# Altium footprint library IDC座子10-64PIN.PcbLib: 24 footprints (part 1 of 2)
Each footprint in its own frame and in the unit in brackets; x right, y up, seen from the top. Pads: shape width x height; smd on the part's side, far side on the other; paste and mask are expansions set on the pad; w line width, h text height; cw(c..) or ccw(c..) is an arc to the next point about the centre after c.
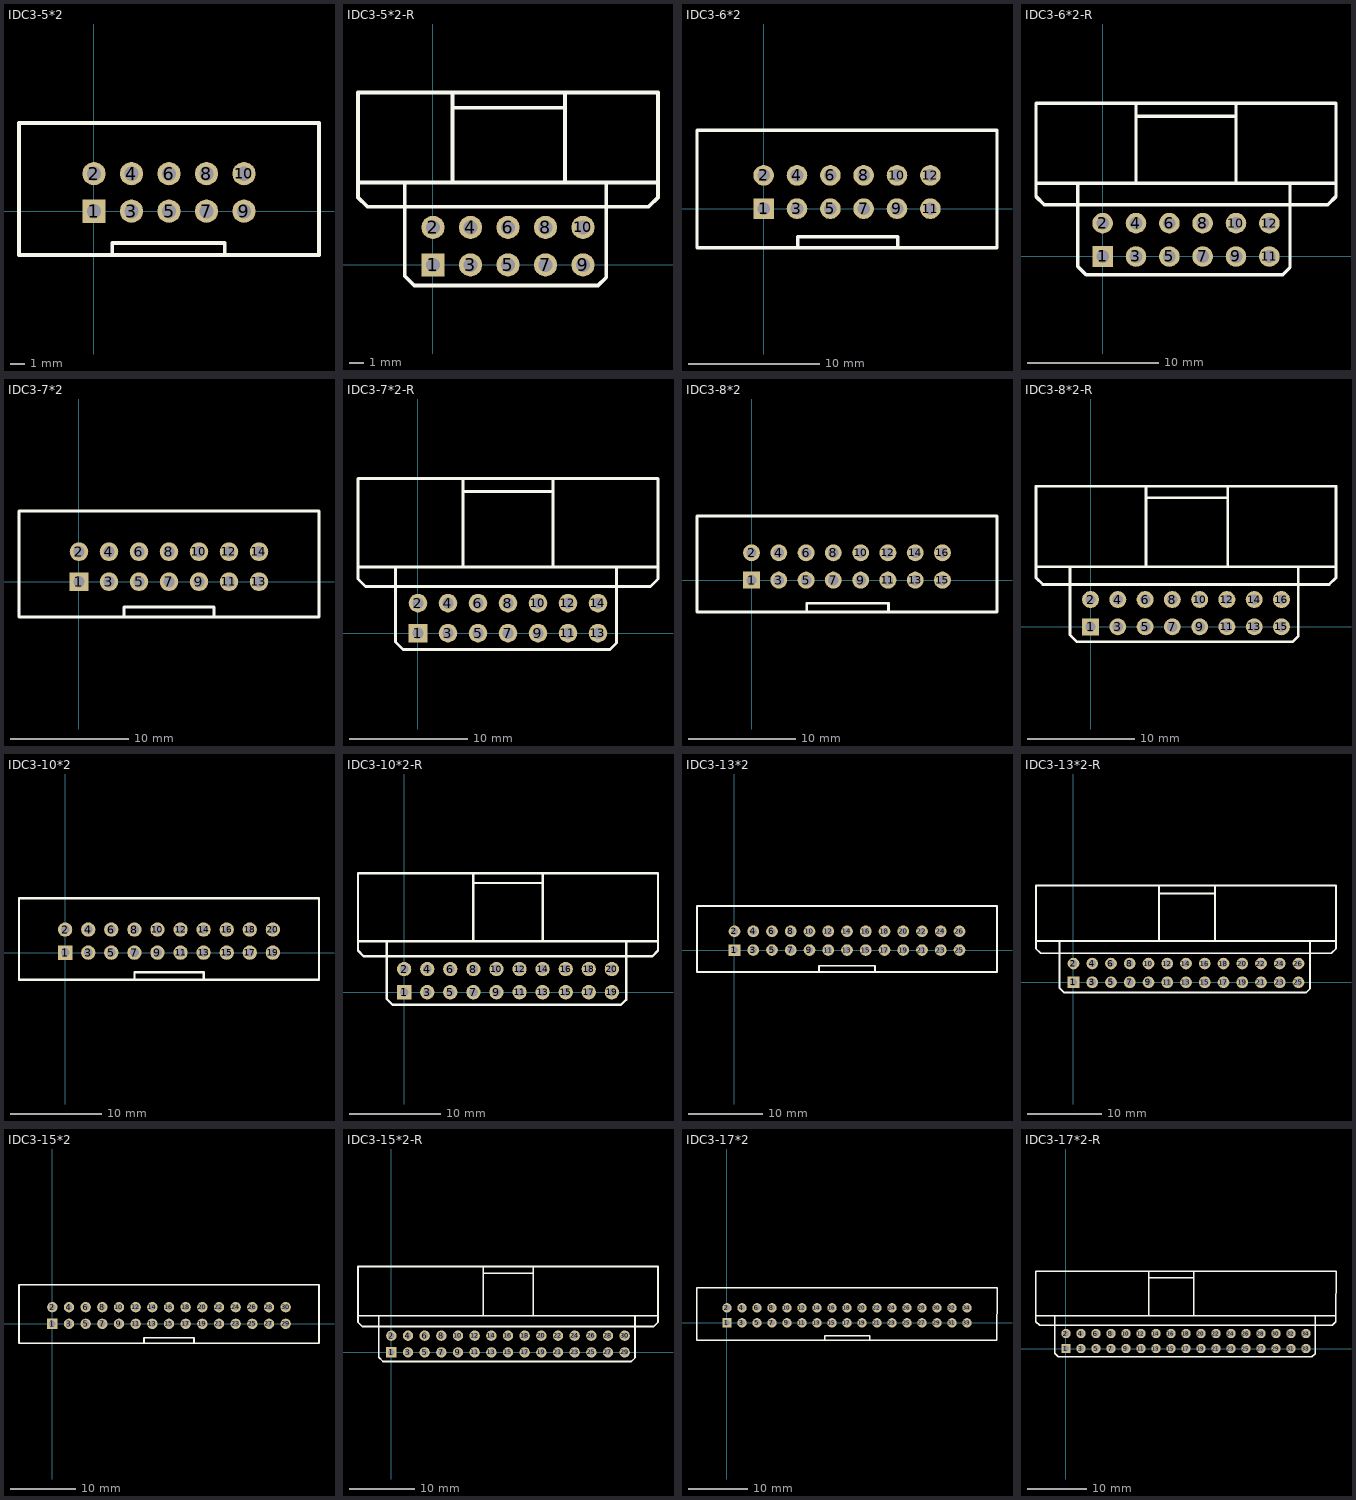
[diagram p0: the footprints below, top view; thin cyan lines are the x and y axes]

## IDC3-5*2 [mil]
pads (10):
  rect 62x62 hole 38: 1(0,0)
  round 62 hole 38: 2(0,100) 3(100,0) 4(100,100) 5(200,0) 6(200,100) 7(300,0) 8(300,100) 9(400,0) 10(400,100)
TopOverlay:
  lines w10: 48.82,-115.67 48.82,-84.65 348.82,-84.65 348.82,-115.67 ; -200,-117.13 600,-117.13 600,235.24 -200,235.24 -200,-117.13
3D body "BH-10.STEP": height 354.33, standoff -133.86, extent -199.61,-117.13 599.61,237.2

## IDC3-5*2-R [mil]
pads (10):
  rect 62x62 hole 38: 1(0,0)
  round 62 hole 38: 2(0,100) 3(100,0) 4(100,100) 5(200,0) 6(200,100) 7(300,0) 8(300,100) 9(400,0) 10(400,100)
TopOverlay:
  lines w8: -76.12,220 -75,218.88
  lines w10: -75,218.88 -75,-30 -50,-55 440,-55 461.88,-33.12 461.88,220 ; 51.77,221.62 51.77,438.22 ; 51.77,458.22 51.77,419.29 351.77,419.29 351.77,458.22 351.77,220.19 ; 461.88,155 575,155 ; 600,221.58 600,460 -200,460 -200,220 ; -200,220 -200,180 -175,155 -75,155 575,155 ; -200,220 600,220 600,180 575,155
3D body "BH-10R.STEP": height 358.27, standoff -110.24, extent -199.61,-12.8 599.61,521.06

## IDC3-6*2 [mil]
pads (12):
  rect 62x62 hole 38: 1(0,0)
  round 62 hole 38: 2(0,100) 3(100,0) 4(100,100) 5(200,0) 6(200,100) 7(300,0) 8(300,100) 9(400,0) 10(400,100) 11(500,0) 12(500,100)
TopOverlay:
  lines w10: 101.97,-115.67 101.97,-84.65 401.97,-84.65 401.97,-115.67 ; -200,-117.13 -200,235.24 700,235.24 700,-117.13 -200,-117.13
3D body "BH-12.STEP": height 354.33, standoff -133.86, extent -198.82,-117.13 698.82,237.2

## IDC3-6*2-R [mil]
pads (12):
  rect 62x62 hole 38: 1(0,0)
  round 62 hole 38: 2(0,100) 3(100,0) 4(100,100) 5(200,0) 6(200,100) 7(300,0) 8(300,100) 9(400,0) 10(400,100) 11(500,0) 12(500,100)
TopOverlay:
  lines w8: -76.12,220 -75,218.88
  lines w10: -75,218.88 -75,-30 -50,-55 540,-55 561.88,-33.12 561.88,220 ; 100,222.61 100,439.2 ; 100,459.2 100,420.28 400,420.28 400,459.2 ; 400,220.78 400,439.2 ; 561.88,155 675,155 ; -200,220 700,220 ; -200,220 -200,460 700,460 700,220 ; -200,220 -200,180 -175,155 -75,155 675,155 ; 675,155 700,180 700,220
3D body "BH-12R.STEP": height 358.27, standoff -110.24, extent -198.82,-11.22 698.82,522.64

## IDC3-7*2 [mil]
pads (14):
  rect 62x62 hole 38: 1(0,0)
  round 62 hole 38: 2(0,100) 3(100,0) 4(100,100) 5(200,0) 6(200,100) 7(300,0) 8(300,100) 9(400,0) 10(400,100) 11(500,0) 12(500,100) 13(600,0) 14(600,100)
TopOverlay:
  lines w10: 150.2,-115.67 150.2,-84.65 450.2,-84.65 450.2,-115.67 ; -200,-117.13 -200,235.24 800,235.24 800,-117.13 -200,-117.13
3D body "BH-14.STEP": height 354.33, standoff -133.86, extent -197.83,-122.05 802.17,232.28

## IDC3-7*2-R [mil]
pads (14):
  rect 62x62 hole 38: 1(0,0)
  round 62 hole 38: 2(0,100) 3(100,0) 4(100,100) 5(200,0) 6(200,100) 7(300,0) 8(300,100) 9(400,0) 10(400,100) 11(500,0) 12(500,100) 13(600,0) 14(600,100)
TopOverlay:
  lines w8: -76.12,220 -75,218.88
  lines w10: -75,218.88 -75,-30 -50,-55 640,-55 661.88,-33.12 661.88,220 ; 150,222.42 150,472.44 ; 150,514.76 150,472.44 ; 450,220.59 450,472.44 ; 450,514.76 450,472.44 ; 661.88,155 775,155 ; -200,220 -200,180 -175,155 -75,155 775,155 ; -200,220 -200,515.75 800,515.75 800,220 ; -200,220 800,220 ; 150,472.44 450,472.44 ; 775,155 800,180 800,220
3D body "BH-14R.STEP": height 358.27, standoff -110.24, extent -197.83,-13.78 802.17,520.08

## IDC3-8*2 [mil]
pads (16):
  rect 62x62 hole 38: 1(0,0)
  round 62 hole 38: 2(0,100) 3(100,0) 4(100,100) 5(200,0) 6(200,100) 7(300,0) 8(300,100) 9(400,0) 10(400,100) 11(500,0) 12(500,100) 13(600,0) 14(600,100) 15(700,0) 16(700,100)
TopOverlay:
  lines w10: 202.36,-115.67 202.36,-84.65 502.36,-84.65 502.36,-115.67 ; -200,-117.13 900,-117.13 900,235.24 -200,235.24 -200,-117.13
3D body "BH-16.STEP": height 354.33, standoff -133.86, extent -196.86,-116.14 901.57,238.19

## IDC3-8*2-R [mil]
pads (16):
  rect 62x62 hole 38: 1(0,0)
  round 62 hole 38: 2(0,100) 3(100,0) 4(100,100) 5(200,0) 6(200,100) 7(300,0) 8(300,100) 9(400,0) 10(400,100) 11(500,0) 12(500,100) 13(600,0) 14(600,100) 15(700,0) 16(700,100)
TopOverlay:
  lines w8: -76.12,220 -75,218.88
  lines w10: -75,218.88 -75,-30 -50,-55 740,-55 761.88,-33.12 761.88,220 ; 203.54,223.4 203.54,473.43 ; 203.54,515.75 203.54,473.43 ; 503.54,221.58 503.54,473.43 ; 503.54,515.75 503.54,473.43 ; 761.88,155 875,155 ; -200,220 -200,180 -175,155 -75,155 875,155 ; -200,220 -200,515.75 900,515.75 900,220 ; -200,220 900,220 ; 203.54,473.43 503.54,473.43 ; 875,155 900,180 900,220
3D body "BH-16R.STEP": height 358.27, standoff -110.24, extent -197.46,-15.9 900.96,517.96

## IDC3-10*2 [mil]
pads (20):
  rect 62x62 hole 38: 1(0,0)
  round 62 hole 38: 2(0,100) 3(100,0) 4(100,100) 5(200,0) 6(200,100) 7(300,0) 8(300,100) 9(400,0) 10(400,100) 11(500,0) 12(500,100) 13(600,0) 14(600,100) 15(700,0) 16(700,100) 17(800,0) 18(800,100) 19(900,0) 20(900,100)
TopOverlay:
  lines w10: 300.2,-115.67 300.2,-84.64 600.2,-84.64 600.2,-115.67 ; -200,-117.13 -200,235.24 1100,235.24 1100,-117.13 -200,-117.13
3D body "BH-20.STEP": height 354.33, standoff -133.86, extent -199.8,-116.14 1099.41,238.19

## IDC3-10*2-R [mil]
pads (20):
  rect 62x62 hole 38: 1(0,0)
  round 62 hole 38: 2(0,100) 3(100,0) 4(100,100) 5(200,0) 6(200,100) 7(300,0) 8(300,100) 9(400,0) 10(400,100) 11(500,0) 12(500,100) 13(600,0) 14(600,100) 15(700,0) 16(700,100) 17(800,0) 18(800,100) 19(900,0) 20(900,100)
TopOverlay:
  lines w8: -76.12,220 -75,218.88
  lines w10: -75,218.88 -75,-30 -50,-55 940,-55 961.88,-33.12 961.88,220 ; 300,223.4 300,473.43 ; 300,515.75 300,473.43 ; 600,221.58 600,473.43 ; 600,515.75 600,473.43 ; -200,220 1100,220 ; -200,220 -200,515.75 1100,515.75 1100,220 ; -200,220 -200,180 -175,155 -75,155 961.88,155 1075,155 1100,180 1100,220 ; 300,473.43 600,473.43
3D body "BH-20R.STEP": height 358.27, standoff -110.24, extent -200.79,-16.14 1098.43,517.72

## IDC3-13*2 [mil]
pads (26):
  rect 62x62 hole 38: 1(0,0)
  round 62 hole 38: 2(0,100) 3(100,0) 4(100,100) 5(200,0) 6(200,100) 7(300,0) 8(300,100) 9(400,0) 10(400,100) 11(500,0) 12(500,100) 13(600,0) 14(600,100) 15(700,0) 16(700,100) 17(800,0) 18(800,100) 19(900,0) 20(900,100) 21(1000,0) 22(1000,100) 23(1100,0) 24(1100,100) 25(1200,0) 26(1200,100)
TopOverlay:
  lines w10: 450.26,-114.89 450.26,-83.87 750.26,-83.87 750.26,-114.89 ; -200,-117.13 1400,-117.13 1400,235.24 -200,235.24 -200,-117.13
3D body "BH-26.STEP": height 354.33, standoff -133.86, extent -198.95,-114.8 1399.48,239.53

## IDC3-13*2-R [mil]
pads (26):
  rect 62x62 hole 38: 1(0,0)
  round 62 hole 38: 2(0,100) 3(100,0) 4(100,100) 5(200,0) 6(200,100) 7(300,0) 8(300,100) 9(400,0) 10(400,100) 11(500,0) 12(500,100) 13(600,0) 14(600,100) 15(700,0) 16(700,100) 17(800,0) 18(800,100) 19(900,0) 20(900,100) 21(1000,0) 22(1000,100) 23(1100,0) 24(1100,100) 25(1200,0) 26(1200,100)
TopOverlay:
  lines w8: -76.12,220 -75,218.88
  lines w10: -75,218.88 -75,-30 -50,-55 1240,-55 1261.88,-33.12 1261.88,220 ; 455.45,224.37 455.45,474.39 ; 455.45,516.72 455.45,474.39 ; 755.45,222.55 755.45,474.39 ; 755.45,516.72 755.45,474.39 ; -200,220 -200,180 -175,155 -75,155 961.88,155 1375,155 1400,180 1400,220 ; -200,220 -200,515.75 1400,515.75 1400,220 ; -200,220 1400,220 ; 455.45,474.39 755.45,474.39
3D body "BH-26R.STEP": height 358.27, standoff -110.24, extent -200.14,-14 1398.29,519.86

## IDC3-15*2 [mil]
pads (30):
  rect 62x62 hole 38: 1(0,0)
  round 62 hole 38: 2(0,100) 3(100,0) 4(100,100) 5(200,0) 6(200,100) 7(300,0) 8(300,100) 9(400,0) 10(400,100) 11(500,0) 12(500,100) 13(600,0) 14(600,100) 15(700,0) 16(700,100) 17(800,0) 18(800,100) 19(900,0) 20(900,100) 21(1000,0) 22(1000,100) 23(1100,0) 24(1100,100) 25(1200,0) 26(1200,100) 27(1300,0) 28(1300,100) 29(1400,0) 30(1400,100)
TopOverlay:
  lines w10: 549.58,-114.08 549.58,-83.06 849.58,-83.06 849.58,-114.08 ; -200,-117.13 -200,235.24 1600,235.24 1600,-117.13 -200,-117.13
3D body "BH-30.STEP": height 354.33, standoff -133.86, extent -201.44,-115.74 1597.77,238.59

## IDC3-15*2-R [mil]
pads (30):
  rect 62x62 hole 38: 1(0,0)
  round 62 hole 38: 2(0,100) 3(100,0) 4(100,100) 5(200,0) 6(200,100) 7(300,0) 8(300,100) 9(400,0) 10(400,100) 11(500,0) 12(500,100) 13(600,0) 14(600,100) 15(700,0) 16(700,100) 17(800,0) 18(800,100) 19(900,0) 20(900,100) 21(1000,0) 22(1000,100) 23(1100,0) 24(1100,100) 25(1200,0) 26(1200,100) 27(1300,0) 28(1300,100) 29(1400,0) 30(1400,100)
TopOverlay:
  lines w8: -76.12,220 -75,218.88
  lines w10: -75,218.88 -75,-30 -50,-55 1440,-55 1461.88,-33.12 1461.88,220 ; 551.75,224.72 551.75,474.74 ; 551.75,515.75 551.75,474.74 ; 851.75,222.89 851.75,474.74 ; 851.75,515.75 851.75,474.74 ; -200,220 -200,180 -175,155 -75,155 961.88,155 1575,155 1600,180 1600,220 ; -200,220 -200,515.75 1600,515.75 1600,220 ; -200,220 1600,220 ; 551.75,474.74 851.75,474.74
3D body "BH-30R.STEP": height 358.27, standoff -110.24, extent -201.48,-11.07 1597.73,522.79

## IDC3-17*2 [mil]
pads (34):
  rect 62x62 hole 38: 1(0,0)
  round 62 hole 38: 2(0,100) 3(100,0) 4(100,100) 5(200,0) 6(200,100) 7(300,0) 8(300,100) 9(400,0) 10(400,100) 11(500,0) 12(500,100) 13(600,0) 14(600,100) 15(700,0) 16(700,100) 17(800,0) 18(800,100) 19(900,0) 20(900,100) 21(1000,0) 22(1000,100) 23(1100,0) 24(1100,100) 25(1200,0) 26(1200,100) 27(1300,0) 28(1300,100) 29(1400,0) 30(1400,100) 31(1500,0) 32(1500,100) 33(1600,0) 34(1600,100)
TopOverlay:
  lines w10: 651.18,-115.67 651.18,-84.65 951.18,-84.65 951.18,-115.67 ; -200,-117.13 -200,235.24 1800,235.24 1800,-117.13 -200,-117.13
3D body "BH-34.STEP": height 354.33, standoff -133.86, extent -200,-118.61 1800,235.72

## IDC3-17*2-R [mil]
pads (34):
  rect 62x62 hole 38: 1(0,0)
  round 62 hole 38: 2(0,100) 3(100,0) 4(100,100) 5(200,0) 6(200,100) 7(300,0) 8(300,100) 9(400,0) 10(400,100) 11(500,0) 12(500,100) 13(600,0) 14(600,100) 15(700,0) 16(700,100) 17(800,0) 18(800,100) 19(900,0) 20(900,100) 21(1000,0) 22(1000,100) 23(1100,0) 24(1100,100) 25(1200,0) 26(1200,100) 27(1300,0) 28(1300,100) 29(1400,0) 30(1400,100) 31(1500,0) 32(1500,100) 33(1600,0) 34(1600,100)
TopOverlay:
  lines w8: -76.12,220 -75,218.88
  lines w10: -75,218.88 -75,-30 -50,-55 1640,-55 1661.88,-33.12 1661.88,220 ; 551.75,224.72 551.75,473.76 ; 551.75,514.76 551.75,473.76 ; 851.75,222.89 851.75,471.79 ; 851.75,514.11 851.75,471.79 ; -200,220 -200,180 -175,155 -75,155 961.88,155 1775,155 1800,180 1800,220 ; -200,220 -200,515.75 1800,515.75 1800,220 ; -200,220 1800,220 ; 551.75,473.76 551.75,471.79 851.75,471.79
3D body "BH-34R.STEP": height 358.27, standoff -110.24, extent -198.16,-14.17 1801.84,519.69